# Altium footprint library ref-packages.PCBLIB: 1543 footprints (part 80 of 103)
Each footprint in its own frame and in the unit in brackets; x right, y up, seen from the top. Pads: shape width x height; smd on the part's side, far side on the other; paste and mask are expansions set on the pad; w line width, h text height; cw(c..) or ccw(c..) is an arc to the next point about the centre after c.
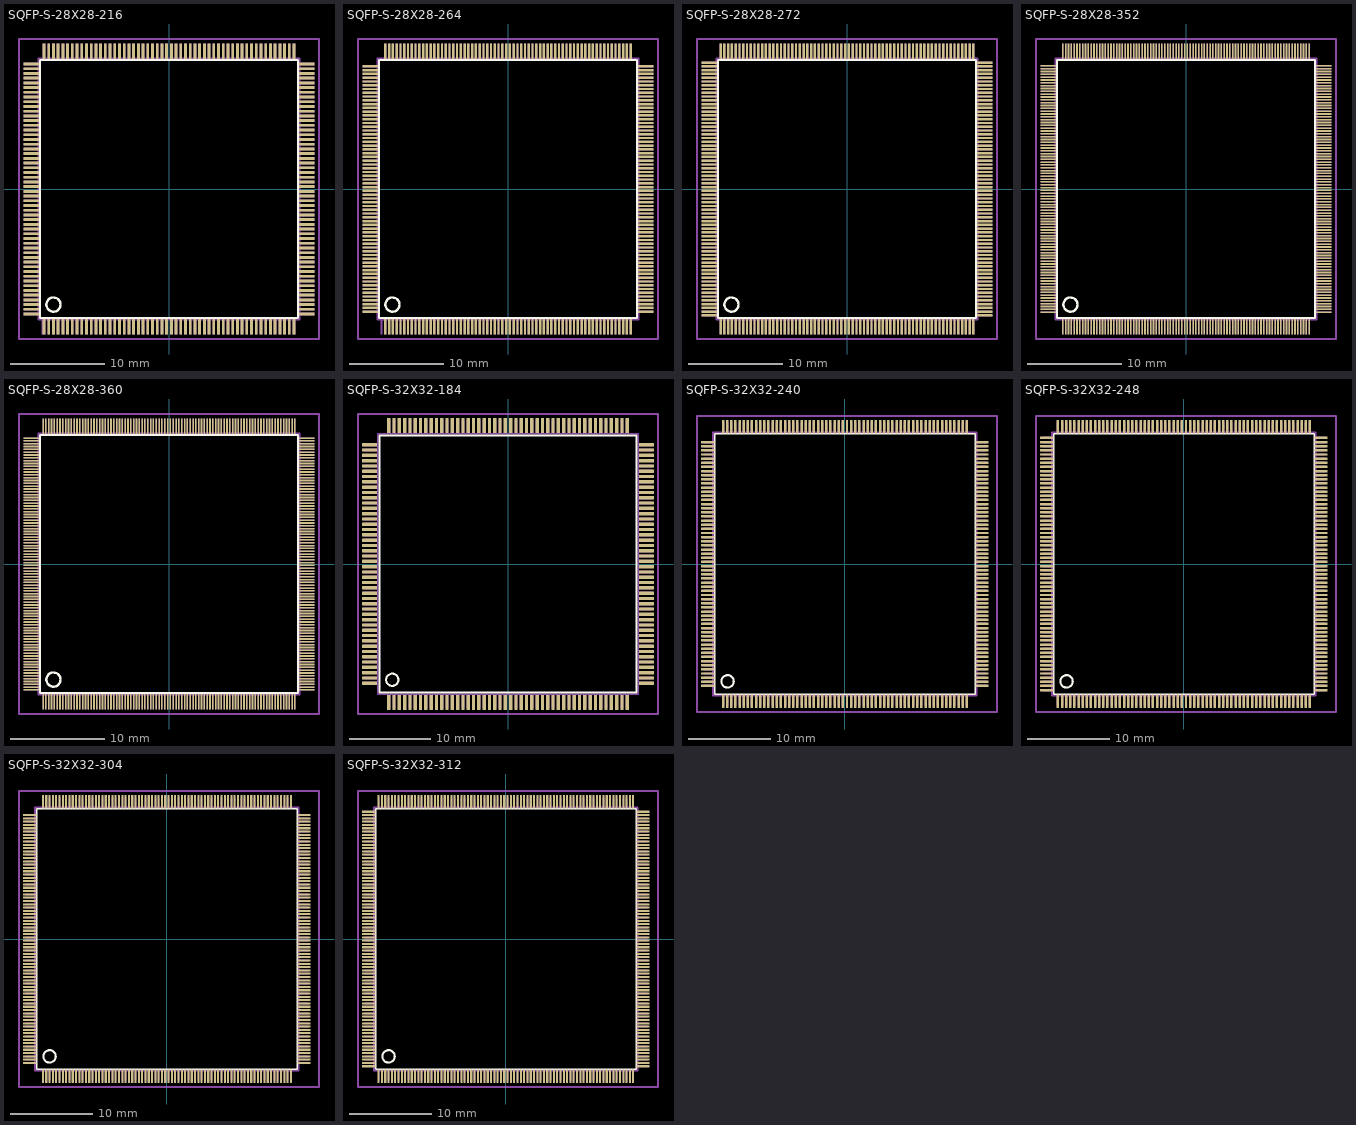
[diagram p79: the footprints below, top view; thin cyan lines are the x and y axes]

## SQFP-S-28X28-216 [mil]
pads (216):
  rect 11.81x62.99 smd: 1(-521.65,-574.8) 2(-501.97,-574.8) 3(-482.28,-574.8) 4(-462.6,-574.8) 5(-442.91,-574.8) 6(-423.23,-574.8) 7(-403.54,-574.8) 8(-383.86,-574.8) 9(-364.17,-574.8) 10(-344.49,-574.8) 11(-324.8,-574.8) 12(-305.12,-574.8) 13(-285.43,-574.8) 14(-265.75,-574.8) 15(-246.06,-574.8) 16(-226.38,-574.8) 17(-206.69,-574.8) 18(-187.01,-574.8) 19(-167.32,-574.8) 20(-147.64,-574.8) 21(-127.95,-574.8) 22(-108.27,-574.8) 23(-88.58,-574.8) 24(-68.9,-574.8) 25(-49.21,-574.8) 26(-29.53,-574.8) 27(-9.84,-574.8) 28(9.84,-574.8) 29(29.53,-574.8) 30(49.21,-574.8) 31(68.9,-574.8) 32(88.58,-574.8) 33(108.27,-574.8) 34(127.95,-574.8) 35(147.64,-574.8) 36(167.32,-574.8) 37(187.01,-574.8) 38(206.69,-574.8) 39(226.38,-574.8) 40(246.06,-574.8) 41(265.75,-574.8) 42(285.43,-574.8) 43(305.12,-574.8) 44(324.8,-574.8) 45(344.49,-574.8) 46(364.17,-574.8) 47(383.86,-574.8) 48(403.54,-574.8) 49(423.23,-574.8) 50(442.91,-574.8) 51(462.6,-574.8) 52(482.28,-574.8) 53(501.97,-574.8) 54(521.65,-574.8) 109(521.65,574.8) 110(501.97,574.8) 111(482.28,574.8) 112(462.6,574.8) 113(442.91,574.8) 114(423.23,574.8) 115(403.54,574.8) 116(383.86,574.8) 117(364.17,574.8) 118(344.49,574.8) 119(324.8,574.8) 120(305.12,574.8) 121(285.43,574.8) 122(265.75,574.8) 123(246.06,574.8) 124(226.38,574.8) 125(206.69,574.8) 126(187.01,574.8) 127(167.32,574.8) 128(147.64,574.8) 129(127.95,574.8) 130(108.27,574.8) 131(88.58,574.8) 132(68.9,574.8) 133(49.21,574.8) 134(29.53,574.8) 135(9.84,574.8) 136(-9.84,574.8) 137(-29.53,574.8) 138(-49.21,574.8) 139(-68.9,574.8) 140(-88.58,574.8) 141(-108.27,574.8) 142(-127.95,574.8) 143(-147.64,574.8) 144(-167.32,574.8) 145(-187.01,574.8) 146(-206.69,574.8) 147(-226.38,574.8) 148(-246.06,574.8) 149(-265.75,574.8) 150(-285.43,574.8) 151(-305.12,574.8) 152(-324.8,574.8) 153(-344.49,574.8) 154(-364.17,574.8) 155(-383.86,574.8) 156(-403.54,574.8) 157(-423.23,574.8) 158(-442.91,574.8) 159(-462.6,574.8) 160(-482.28,574.8) 161(-501.97,574.8) 162(-521.65,574.8)
  rect 62.99x11.81 smd: 55(574.8,-521.65) 56(574.8,-501.97) 57(574.8,-482.28) 58(574.8,-462.6) 59(574.8,-442.91) 60(574.8,-423.23) 61(574.8,-403.54) 62(574.8,-383.86) 63(574.8,-364.17) 64(574.8,-344.49) 65(574.8,-324.8) 66(574.8,-305.12) 67(574.8,-285.43) 68(574.8,-265.75) 69(574.8,-246.06) 70(574.8,-226.38) 71(574.8,-206.69) 72(574.8,-187.01) 73(574.8,-167.32) 74(574.8,-147.64) 75(574.8,-127.95) 76(574.8,-108.27) 77(574.8,-88.58) 78(574.8,-68.9) 79(574.8,-49.21) 80(574.8,-29.53) 81(574.8,-9.84) 82(574.8,9.84) 83(574.8,29.53) 84(574.8,49.21) 85(574.8,68.9) 86(574.8,88.58) 87(574.8,108.27) 88(574.8,127.95) 89(574.8,147.64) 90(574.8,167.32) 91(574.8,187.01) 92(574.8,206.69) 93(574.8,226.38) 94(574.8,246.06) 95(574.8,265.75) 96(574.8,285.43) 97(574.8,305.12) 98(574.8,324.8) 99(574.8,344.49) 100(574.8,364.17) 101(574.8,383.86) 102(574.8,403.54) 103(574.8,423.23) 104(574.8,442.91) 105(574.8,462.6) 106(574.8,482.28) 107(574.8,501.97) 108(574.8,521.65) 163(-574.8,521.65) 164(-574.8,501.97) 165(-574.8,482.28) 166(-574.8,462.6) 167(-574.8,442.91) 168(-574.8,423.23) 169(-574.8,403.54) 170(-574.8,383.86) 171(-574.8,364.17) 172(-574.8,344.49) 173(-574.8,324.8) 174(-574.8,305.12) 175(-574.8,285.43) 176(-574.8,265.75) 177(-574.8,246.06) 178(-574.8,226.38) 179(-574.8,206.69) 180(-574.8,187.01) 181(-574.8,167.32) 182(-574.8,147.64) 183(-574.8,127.95) 184(-574.8,108.27) 185(-574.8,88.58) 186(-574.8,68.9) 187(-574.8,49.21) 188(-574.8,29.53) 189(-574.8,9.84) 190(-574.8,-9.84) 191(-574.8,-29.53) 192(-574.8,-49.21) 193(-574.8,-68.9) 194(-574.8,-88.58) 195(-574.8,-108.27) 196(-574.8,-127.95) 197(-574.8,-147.64) 198(-574.8,-167.32) 199(-574.8,-187.01) 200(-574.8,-206.69) 201(-574.8,-226.38) 202(-574.8,-246.06) 203(-574.8,-265.75) 204(-574.8,-285.43) 205(-574.8,-305.12) 206(-574.8,-324.8) 207(-574.8,-344.49) 208(-574.8,-364.17) 209(-574.8,-383.86) 210(-574.8,-403.54) 211(-574.8,-423.23) 212(-574.8,-442.91) 213(-574.8,-462.6) 214(-574.8,-482.28) 215(-574.8,-501.97) 216(-574.8,-521.65)
Top Overlay:
  circle w10: c-482.28,-482.28 r29.52
  lines w8: -538.19,-537.8 537.8,-537.8 537.8,537.8 -538.19,537.8 -538.19,-537.8
Mechanical 16:
  drawing of 221 lines, arcs and shapes, not listed
Mechanical 27:
  lines w7.87: -625.98,-625.98 -625.98,625.98 625.98,625.98 625.98,-625.98 -625.98,-625.98

## SQFP-S-28X28-264 [mm]
pads (264):
  rect 0.25x1.6 smd: 1(-13,-14.6) 2(-12.6,-14.6) 3(-12.2,-14.6) 4(-11.8,-14.6) 5(-11.4,-14.6) 6(-11,-14.6) 7(-10.6,-14.6) 8(-10.2,-14.6) 9(-9.8,-14.6) 10(-9.4,-14.6) 11(-9,-14.6) 12(-8.6,-14.6) 13(-8.2,-14.6) 14(-7.8,-14.6) 15(-7.4,-14.6) 16(-7,-14.6) 17(-6.6,-14.6) 18(-6.2,-14.6) 19(-5.8,-14.6) 20(-5.4,-14.6) 21(-5,-14.6) 22(-4.6,-14.6) 23(-4.2,-14.6) 24(-3.8,-14.6) 25(-3.4,-14.6) 26(-3,-14.6) 27(-2.6,-14.6) 28(-2.2,-14.6) 29(-1.8,-14.6) 30(-1.4,-14.6) 31(-1,-14.6) 32(-0.6,-14.6) 33(-0.2,-14.6) 34(0.2,-14.6) 35(0.6,-14.6) 36(1,-14.6) 37(1.4,-14.6) 38(1.8,-14.6) 39(2.2,-14.6) 40(2.6,-14.6) 41(3,-14.6) 42(3.4,-14.6) 43(3.8,-14.6) 44(4.2,-14.6) 45(4.6,-14.6) 46(5,-14.6) 47(5.4,-14.6) 48(5.8,-14.6) 49(6.2,-14.6) 50(6.6,-14.6) 51(7,-14.6) 52(7.4,-14.6) 53(7.8,-14.6) 54(8.2,-14.6) 55(8.6,-14.6) 56(9,-14.6) 57(9.4,-14.6) 58(9.8,-14.6) 59(10.2,-14.6) 60(10.6,-14.6) 61(11,-14.6) 62(11.4,-14.6) 63(11.8,-14.6) 64(12.2,-14.6) 65(12.6,-14.6) 66(13,-14.6) 133(13,14.6) 134(12.6,14.6) 135(12.2,14.6) 136(11.8,14.6) 137(11.4,14.6) 138(11,14.6) 139(10.6,14.6) 140(10.2,14.6) 141(9.8,14.6) 142(9.4,14.6) 143(9,14.6) 144(8.6,14.6) 145(8.2,14.6) 146(7.8,14.6) 147(7.4,14.6) 148(7,14.6) 149(6.6,14.6) 150(6.2,14.6) 151(5.8,14.6) 152(5.4,14.6) 153(5,14.6) 154(4.6,14.6) 155(4.2,14.6) 156(3.8,14.6) 157(3.4,14.6) 158(3,14.6) 159(2.6,14.6) 160(2.2,14.6) 161(1.8,14.6) 162(1.4,14.6) 163(1,14.6) 164(0.6,14.6) 165(0.2,14.6) 166(-0.2,14.6) 167(-0.6,14.6) 168(-1,14.6) 169(-1.4,14.6) 170(-1.8,14.6) 171(-2.2,14.6) 172(-2.6,14.6) 173(-3,14.6) 174(-3.4,14.6) 175(-3.8,14.6) 176(-4.2,14.6) 177(-4.6,14.6) 178(-5,14.6) 179(-5.4,14.6) 180(-5.8,14.6) 181(-6.2,14.6) 182(-6.6,14.6) 183(-7,14.6) 184(-7.4,14.6) 185(-7.8,14.6) 186(-8.2,14.6) 187(-8.6,14.6) 188(-9,14.6) 189(-9.4,14.6) 190(-9.8,14.6) 191(-10.2,14.6) 192(-10.6,14.6) 193(-11,14.6) 194(-11.4,14.6) 195(-11.8,14.6) 196(-12.2,14.6) 197(-12.6,14.6) 198(-13,14.6)
  rect 1.6x0.25 smd: 67(14.6,-13) 68(14.6,-12.6) 69(14.6,-12.2) 70(14.6,-11.8) 71(14.6,-11.4) 72(14.6,-11) 73(14.6,-10.6) 74(14.6,-10.2) 75(14.6,-9.8) 76(14.6,-9.4) 77(14.6,-9) 78(14.6,-8.6) 79(14.6,-8.2) 80(14.6,-7.8) 81(14.6,-7.4) 82(14.6,-7) 83(14.6,-6.6) 84(14.6,-6.2) 85(14.6,-5.8) 86(14.6,-5.4) 87(14.6,-5) 88(14.6,-4.6) 89(14.6,-4.2) 90(14.6,-3.8) 91(14.6,-3.4) 92(14.6,-3) 93(14.6,-2.6) 94(14.6,-2.2) 95(14.6,-1.8) 96(14.6,-1.4) 97(14.6,-1) 98(14.6,-0.6) 99(14.6,-0.2) 100(14.6,0.2) 101(14.6,0.6) 102(14.6,1) 103(14.6,1.4) 104(14.6,1.8) 105(14.6,2.2) 106(14.6,2.6) 107(14.6,3) 108(14.6,3.4) 109(14.6,3.8) 110(14.6,4.2) 111(14.6,4.6) 112(14.6,5) 113(14.6,5.4) 114(14.6,5.8) 115(14.6,6.2) 116(14.6,6.6) 117(14.6,7) 118(14.6,7.4) 119(14.6,7.8) 120(14.6,8.2) 121(14.6,8.6) 122(14.6,9) 123(14.6,9.4) 124(14.6,9.8) 125(14.6,10.2) 126(14.6,10.6) 127(14.6,11) 128(14.6,11.4) 129(14.6,11.8) 130(14.6,12.2) 131(14.6,12.6) 132(14.6,13) 199(-14.6,13) 200(-14.6,12.6) 201(-14.6,12.2) 202(-14.6,11.8) 203(-14.6,11.4) 204(-14.6,11) 205(-14.6,10.6) 206(-14.6,10.2) 207(-14.6,9.8) 208(-14.6,9.4) 209(-14.6,9) 210(-14.6,8.6) 211(-14.6,8.2) 212(-14.6,7.8) 213(-14.6,7.4) 214(-14.6,7) 215(-14.6,6.6) 216(-14.6,6.2) 217(-14.6,5.8) 218(-14.6,5.4) 219(-14.6,5) 220(-14.6,4.6) 221(-14.6,4.2) 222(-14.6,3.8) 223(-14.6,3.4) 224(-14.6,3) 225(-14.6,2.6) 226(-14.6,2.2) 227(-14.6,1.8) 228(-14.6,1.4) 229(-14.6,1) 230(-14.6,0.6) 231(-14.6,0.2) 232(-14.6,-0.2) 233(-14.6,-0.6) 234(-14.6,-1) 235(-14.6,-1.4) 236(-14.6,-1.8) 237(-14.6,-2.2) 238(-14.6,-2.6) 239(-14.6,-3) 240(-14.6,-3.4) 241(-14.6,-3.8) 242(-14.6,-4.2) 243(-14.6,-4.6) 244(-14.6,-5) 245(-14.6,-5.4) 246(-14.6,-5.8) 247(-14.6,-6.2) 248(-14.6,-6.6) 249(-14.6,-7) 250(-14.6,-7.4) 251(-14.6,-7.8) 252(-14.6,-8.2) 253(-14.6,-8.6) 254(-14.6,-9) 255(-14.6,-9.4) 256(-14.6,-9.8) 257(-14.6,-10.2) 258(-14.6,-10.6) 259(-14.6,-11) 260(-14.6,-11.4) 261(-14.6,-11.8) 262(-14.6,-12.2) 263(-14.6,-12.6) 264(-14.6,-13)
Top Overlay:
  circle w0.254: c-12.25,-12.25 r0.75
  lines w0.203: -13.67,-13.66 13.66,-13.66 13.66,13.66 -13.67,13.66 -13.67,-13.66
Mechanical 16:
  drawing of 269 lines, arcs and shapes, not listed
Mechanical 27:
  lines w0.2: -15.9,-15.9 -15.9,15.9 15.9,15.9 15.9,-15.9 -15.9,-15.9

## SQFP-S-28X28-272 [mm]
pads (272):
  rect 0.25x1.6 smd: 1(-13.4,-14.6) 2(-13,-14.6) 3(-12.6,-14.6) 4(-12.2,-14.6) 5(-11.8,-14.6) 6(-11.4,-14.6) 7(-11,-14.6) 8(-10.6,-14.6) 9(-10.2,-14.6) 10(-9.8,-14.6) 11(-9.4,-14.6) 12(-9,-14.6) 13(-8.6,-14.6) 14(-8.2,-14.6) 15(-7.8,-14.6) 16(-7.4,-14.6) 17(-7,-14.6) 18(-6.6,-14.6) 19(-6.2,-14.6) 20(-5.8,-14.6) 21(-5.4,-14.6) 22(-5,-14.6) 23(-4.6,-14.6) 24(-4.2,-14.6) 25(-3.8,-14.6) 26(-3.4,-14.6) 27(-3,-14.6) 28(-2.6,-14.6) 29(-2.2,-14.6) 30(-1.8,-14.6) 31(-1.4,-14.6) 32(-1,-14.6) 33(-0.6,-14.6) 34(-0.2,-14.6) 35(0.2,-14.6) 36(0.6,-14.6) 37(1,-14.6) 38(1.4,-14.6) 39(1.8,-14.6) 40(2.2,-14.6) 41(2.6,-14.6) 42(3,-14.6) 43(3.4,-14.6) 44(3.8,-14.6) 45(4.2,-14.6) 46(4.6,-14.6) 47(5,-14.6) 48(5.4,-14.6) 49(5.8,-14.6) 50(6.2,-14.6) 51(6.6,-14.6) 52(7,-14.6) 53(7.4,-14.6) 54(7.8,-14.6) 55(8.2,-14.6) 56(8.6,-14.6) 57(9,-14.6) 58(9.4,-14.6) 59(9.8,-14.6) 60(10.2,-14.6) 61(10.6,-14.6) 62(11,-14.6) 63(11.4,-14.6) 64(11.8,-14.6) 65(12.2,-14.6) 66(12.6,-14.6) 67(13,-14.6) 68(13.4,-14.6) 137(13.4,14.6) 138(13,14.6) 139(12.6,14.6) 140(12.2,14.6) 141(11.8,14.6) 142(11.4,14.6) 143(11,14.6) 144(10.6,14.6) 145(10.2,14.6) 146(9.8,14.6) 147(9.4,14.6) 148(9,14.6) 149(8.6,14.6) 150(8.2,14.6) 151(7.8,14.6) 152(7.4,14.6) 153(7,14.6) 154(6.6,14.6) 155(6.2,14.6) 156(5.8,14.6) 157(5.4,14.6) 158(5,14.6) 159(4.6,14.6) 160(4.2,14.6) 161(3.8,14.6) 162(3.4,14.6) 163(3,14.6) 164(2.6,14.6) 165(2.2,14.6) 166(1.8,14.6) 167(1.4,14.6) 168(1,14.6) 169(0.6,14.6) 170(0.2,14.6) 171(-0.2,14.6) 172(-0.6,14.6) 173(-1,14.6) 174(-1.4,14.6) 175(-1.8,14.6) 176(-2.2,14.6) 177(-2.6,14.6) 178(-3,14.6) 179(-3.4,14.6) 180(-3.8,14.6) 181(-4.2,14.6) 182(-4.6,14.6) 183(-5,14.6) 184(-5.4,14.6) 185(-5.8,14.6) 186(-6.2,14.6) 187(-6.6,14.6) 188(-7,14.6) 189(-7.4,14.6) 190(-7.8,14.6) 191(-8.2,14.6) 192(-8.6,14.6) 193(-9,14.6) 194(-9.4,14.6) 195(-9.8,14.6) 196(-10.2,14.6) 197(-10.6,14.6) 198(-11,14.6) 199(-11.4,14.6) 200(-11.8,14.6) 201(-12.2,14.6) 202(-12.6,14.6) 203(-13,14.6) 204(-13.4,14.6)
  rect 1.6x0.25 smd: 69(14.6,-13.4) 70(14.6,-13) 71(14.6,-12.6) 72(14.6,-12.2) 73(14.6,-11.8) 74(14.6,-11.4) 75(14.6,-11) 76(14.6,-10.6) 77(14.6,-10.2) 78(14.6,-9.8) 79(14.6,-9.4) 80(14.6,-9) 81(14.6,-8.6) 82(14.6,-8.2) 83(14.6,-7.8) 84(14.6,-7.4) 85(14.6,-7) 86(14.6,-6.6) 87(14.6,-6.2) 88(14.6,-5.8) 89(14.6,-5.4) 90(14.6,-5) 91(14.6,-4.6) 92(14.6,-4.2) 93(14.6,-3.8) 94(14.6,-3.4) 95(14.6,-3) 96(14.6,-2.6) 97(14.6,-2.2) 98(14.6,-1.8) 99(14.6,-1.4) 100(14.6,-1) 101(14.6,-0.6) 102(14.6,-0.2) 103(14.6,0.2) 104(14.6,0.6) 105(14.6,1) 106(14.6,1.4) 107(14.6,1.8) 108(14.6,2.2) 109(14.6,2.6) 110(14.6,3) 111(14.6,3.4) 112(14.6,3.8) 113(14.6,4.2) 114(14.6,4.6) 115(14.6,5) 116(14.6,5.4) 117(14.6,5.8) 118(14.6,6.2) 119(14.6,6.6) 120(14.6,7) 121(14.6,7.4) 122(14.6,7.8) 123(14.6,8.2) 124(14.6,8.6) 125(14.6,9) 126(14.6,9.4) 127(14.6,9.8) 128(14.6,10.2) 129(14.6,10.6) 130(14.6,11) 131(14.6,11.4) 132(14.6,11.8) 133(14.6,12.2) 134(14.6,12.6) 135(14.6,13) 136(14.6,13.4) 205(-14.6,13.4) 206(-14.6,13) 207(-14.6,12.6) 208(-14.6,12.2) 209(-14.6,11.8) 210(-14.6,11.4) 211(-14.6,11) 212(-14.6,10.6) 213(-14.6,10.2) 214(-14.6,9.8) 215(-14.6,9.4) 216(-14.6,9) 217(-14.6,8.6) 218(-14.6,8.2) 219(-14.6,7.8) 220(-14.6,7.4) 221(-14.6,7) 222(-14.6,6.6) 223(-14.6,6.2) 224(-14.6,5.8) 225(-14.6,5.4) 226(-14.6,5) 227(-14.6,4.6) 228(-14.6,4.2) 229(-14.6,3.8) 230(-14.6,3.4) 231(-14.6,3) 232(-14.6,2.6) 233(-14.6,2.2) 234(-14.6,1.8) 235(-14.6,1.4) 236(-14.6,1) 237(-14.6,0.6) 238(-14.6,0.2) 239(-14.6,-0.2) 240(-14.6,-0.6) 241(-14.6,-1) 242(-14.6,-1.4) 243(-14.6,-1.8) 244(-14.6,-2.2) 245(-14.6,-2.6) 246(-14.6,-3) 247(-14.6,-3.4) 248(-14.6,-3.8) 249(-14.6,-4.2) 250(-14.6,-4.6) 251(-14.6,-5) 252(-14.6,-5.4) 253(-14.6,-5.8) 254(-14.6,-6.2) 255(-14.6,-6.6) 256(-14.6,-7) 257(-14.6,-7.4) 258(-14.6,-7.8) 259(-14.6,-8.2) 260(-14.6,-8.6) 261(-14.6,-9) 262(-14.6,-9.4) 263(-14.6,-9.8) 264(-14.6,-10.2) 265(-14.6,-10.6) 266(-14.6,-11) 267(-14.6,-11.4) 268(-14.6,-11.8) 269(-14.6,-12.2) 270(-14.6,-12.6) 271(-14.6,-13) 272(-14.6,-13.4)
Top Overlay:
  circle w0.254: c-12.25,-12.25 r0.75
  lines w0.203: -13.67,-13.66 13.66,-13.66 13.66,13.66 -13.67,13.66 -13.67,-13.66
Mechanical 16:
  drawing of 276 lines, arcs and shapes, not listed
Mechanical 27:
  lines w0.2: -15.9,-15.9 -15.9,15.9 15.9,15.9 15.9,-15.9 -15.9,-15.9

## SQFP-S-28X28-352 [mm]
pads (352):
  rect 0.17x1.6 smd: 1(-13.05,-14.6) 2(-12.75,-14.6) 3(-12.45,-14.6) 4(-12.15,-14.6) 5(-11.85,-14.6) 6(-11.55,-14.6) 7(-11.25,-14.6) 8(-10.95,-14.6) 9(-10.65,-14.6) 10(-10.35,-14.6) 11(-10.05,-14.6) 12(-9.75,-14.6) 13(-9.45,-14.6) 14(-9.15,-14.6) 15(-8.85,-14.6) 16(-8.55,-14.6) 17(-8.25,-14.6) 18(-7.95,-14.6) 19(-7.65,-14.6) 20(-7.35,-14.6) 21(-7.05,-14.6) 22(-6.75,-14.6) 23(-6.45,-14.6) 24(-6.15,-14.6) 25(-5.85,-14.6) 26(-5.55,-14.6) 27(-5.25,-14.6) 28(-4.95,-14.6) 29(-4.65,-14.6) 30(-4.35,-14.6) 31(-4.05,-14.6) 32(-3.75,-14.6) 33(-3.45,-14.6) 34(-3.15,-14.6) 35(-2.85,-14.6) 36(-2.55,-14.6) 37(-2.25,-14.6) 38(-1.95,-14.6) 39(-1.65,-14.6) 40(-1.35,-14.6) 41(-1.05,-14.6) 42(-0.75,-14.6) 43(-0.45,-14.6) 44(-0.15,-14.6) 45(0.15,-14.6) 46(0.45,-14.6) 47(0.75,-14.6) 48(1.05,-14.6) 49(1.35,-14.6) 50(1.65,-14.6) 51(1.95,-14.6) 52(2.25,-14.6) 53(2.55,-14.6) 54(2.85,-14.6) 55(3.15,-14.6) 56(3.45,-14.6) 57(3.75,-14.6) 58(4.05,-14.6) 59(4.35,-14.6) 60(4.65,-14.6) 61(4.95,-14.6) 62(5.25,-14.6) 63(5.55,-14.6) 64(5.85,-14.6) 65(6.15,-14.6) 66(6.45,-14.6) 67(6.75,-14.6) 68(7.05,-14.6) 69(7.35,-14.6) 70(7.65,-14.6) 71(7.95,-14.6) 72(8.25,-14.6) 73(8.55,-14.6) 74(8.85,-14.6) 75(9.15,-14.6) 76(9.45,-14.6) 77(9.75,-14.6) 78(10.05,-14.6) 79(10.35,-14.6) 80(10.65,-14.6) 81(10.95,-14.6) 82(11.25,-14.6) 83(11.55,-14.6) 84(11.85,-14.6) 85(12.15,-14.6) 86(12.45,-14.6) 87(12.75,-14.6) 88(13.05,-14.6) 177(13.05,14.6) 178(12.75,14.6) 179(12.45,14.6) 180(12.15,14.6) 181(11.85,14.6) 182(11.55,14.6) 183(11.25,14.6) 184(10.95,14.6) 185(10.65,14.6) 186(10.35,14.6) 187(10.05,14.6) 188(9.75,14.6) 189(9.45,14.6) 190(9.15,14.6) 191(8.85,14.6) 192(8.55,14.6) 193(8.25,14.6) 194(7.95,14.6) 195(7.65,14.6) 196(7.35,14.6) 197(7.05,14.6) 198(6.75,14.6) 199(6.45,14.6) 200(6.15,14.6) 201(5.85,14.6) 202(5.55,14.6) 203(5.25,14.6) 204(4.95,14.6) 205(4.65,14.6) 206(4.35,14.6) 207(4.05,14.6) 208(3.75,14.6) 209(3.45,14.6) 210(3.15,14.6) 211(2.85,14.6) 212(2.55,14.6) 213(2.25,14.6) 214(1.95,14.6) 215(1.65,14.6) 216(1.35,14.6) 217(1.05,14.6) 218(0.75,14.6) 219(0.45,14.6) 220(0.15,14.6) 221(-0.15,14.6) 222(-0.45,14.6) 223(-0.75,14.6) 224(-1.05,14.6) 225(-1.35,14.6) 226(-1.65,14.6) 227(-1.95,14.6) 228(-2.25,14.6) 229(-2.55,14.6) 230(-2.85,14.6) 231(-3.15,14.6) 232(-3.45,14.6) 233(-3.75,14.6) 234(-4.05,14.6) 235(-4.35,14.6) 236(-4.65,14.6) 237(-4.95,14.6) 238(-5.25,14.6) 239(-5.55,14.6) 240(-5.85,14.6) 241(-6.15,14.6) 242(-6.45,14.6) 243(-6.75,14.6) 244(-7.05,14.6) 245(-7.35,14.6) 246(-7.65,14.6) 247(-7.95,14.6) 248(-8.25,14.6) 249(-8.55,14.6) 250(-8.85,14.6) 251(-9.15,14.6) 252(-9.45,14.6) 253(-9.75,14.6) 254(-10.05,14.6) 255(-10.35,14.6) 256(-10.65,14.6) 257(-10.95,14.6) 258(-11.25,14.6) 259(-11.55,14.6) 260(-11.85,14.6) 261(-12.15,14.6) 262(-12.45,14.6) 263(-12.75,14.6) 264(-13.05,14.6)
  rect 1.6x0.17 smd: 89(14.6,-13.05) 90(14.6,-12.75) 91(14.6,-12.45) 92(14.6,-12.15) 93(14.6,-11.85) 94(14.6,-11.55) 95(14.6,-11.25) 96(14.6,-10.95) 97(14.6,-10.65) 98(14.6,-10.35) 99(14.6,-10.05) 100(14.6,-9.75) 101(14.6,-9.45) 102(14.6,-9.15) 103(14.6,-8.85) 104(14.6,-8.55) 105(14.6,-8.25) 106(14.6,-7.95) 107(14.6,-7.65) 108(14.6,-7.35) 109(14.6,-7.05) 110(14.6,-6.75) 111(14.6,-6.45) 112(14.6,-6.15) 113(14.6,-5.85) 114(14.6,-5.55) 115(14.6,-5.25) 116(14.6,-4.95) 117(14.6,-4.65) 118(14.6,-4.35) 119(14.6,-4.05) 120(14.6,-3.75) 121(14.6,-3.45) 122(14.6,-3.15) 123(14.6,-2.85) 124(14.6,-2.55) 125(14.6,-2.25) 126(14.6,-1.95) 127(14.6,-1.65) 128(14.6,-1.35) 129(14.6,-1.05) 130(14.6,-0.75) 131(14.6,-0.45) 132(14.6,-0.15) 133(14.6,0.15) 134(14.6,0.45) 135(14.6,0.75) 136(14.6,1.05) 137(14.6,1.35) 138(14.6,1.65) 139(14.6,1.95) 140(14.6,2.25) 141(14.6,2.55) 142(14.6,2.85) 143(14.6,3.15) 144(14.6,3.45) 145(14.6,3.75) 146(14.6,4.05) 147(14.6,4.35) 148(14.6,4.65) 149(14.6,4.95) 150(14.6,5.25) 151(14.6,5.55) 152(14.6,5.85) 153(14.6,6.15) 154(14.6,6.45) 155(14.6,6.75) 156(14.6,7.05) 157(14.6,7.35) 158(14.6,7.65) 159(14.6,7.95) 160(14.6,8.25) 161(14.6,8.55) 162(14.6,8.85) 163(14.6,9.15) 164(14.6,9.45) 165(14.6,9.75) 166(14.6,10.05) 167(14.6,10.35) 168(14.6,10.65) 169(14.6,10.95) 170(14.6,11.25) 171(14.6,11.55) 172(14.6,11.85) 173(14.6,12.15) 174(14.6,12.45) 175(14.6,12.75) 176(14.6,13.05) 265(-14.6,13.05) 266(-14.6,12.75) 267(-14.6,12.45) 268(-14.6,12.15) 269(-14.6,11.85) 270(-14.6,11.55) 271(-14.6,11.25) 272(-14.6,10.95) 273(-14.6,10.65) 274(-14.6,10.35) 275(-14.6,10.05) 276(-14.6,9.75) 277(-14.6,9.45) 278(-14.6,9.15) 279(-14.6,8.85) 280(-14.6,8.55) 281(-14.6,8.25) 282(-14.6,7.95) 283(-14.6,7.65) 284(-14.6,7.35) 285(-14.6,7.05) 286(-14.6,6.75) 287(-14.6,6.45) 288(-14.6,6.15) 289(-14.6,5.85) 290(-14.6,5.55) 291(-14.6,5.25) 292(-14.6,4.95) 293(-14.6,4.65) 294(-14.6,4.35) 295(-14.6,4.05) 296(-14.6,3.75) 297(-14.6,3.45) 298(-14.6,3.15) 299(-14.6,2.85) 300(-14.6,2.55) 301(-14.6,2.25) 302(-14.6,1.95) 303(-14.6,1.65) 304(-14.6,1.35) 305(-14.6,1.05) 306(-14.6,0.75) 307(-14.6,0.45) 308(-14.6,0.15) 309(-14.6,-0.15) 310(-14.6,-0.45) 311(-14.6,-0.75) 312(-14.6,-1.05) 313(-14.6,-1.35) 314(-14.6,-1.65) 315(-14.6,-1.95) 316(-14.6,-2.25) 317(-14.6,-2.55) 318(-14.6,-2.85) 319(-14.6,-3.15) 320(-14.6,-3.45) 321(-14.6,-3.75) 322(-14.6,-4.05) 323(-14.6,-4.35) 324(-14.6,-4.65) 325(-14.6,-4.95) 326(-14.6,-5.25) 327(-14.6,-5.55) 328(-14.6,-5.85) 329(-14.6,-6.15) 330(-14.6,-6.45) 331(-14.6,-6.75) 332(-14.6,-7.05) 333(-14.6,-7.35) 334(-14.6,-7.65) 335(-14.6,-7.95) 336(-14.6,-8.25) 337(-14.6,-8.55) 338(-14.6,-8.85) 339(-14.6,-9.15) 340(-14.6,-9.45) 341(-14.6,-9.75) 342(-14.6,-10.05) 343(-14.6,-10.35) 344(-14.6,-10.65) 345(-14.6,-10.95) 346(-14.6,-11.25) 347(-14.6,-11.55) 348(-14.6,-11.85) 349(-14.6,-12.15) 350(-14.6,-12.45) 351(-14.6,-12.75) 352(-14.6,-13.05)
Top Overlay:
  circle w0.254: c-12.25,-12.25 r0.75
  lines w0.203: -13.67,-13.66 13.66,-13.66 13.66,13.66 -13.67,13.66 -13.67,-13.66
Mechanical 16:
  drawing of 356 lines, arcs and shapes, not listed
Mechanical 27:
  lines w0.2: -15.9,-15.9 -15.9,15.9 15.9,15.9 15.9,-15.9 -15.9,-15.9

## SQFP-S-28X28-360 [mm]
pads (360):
  rect 0.17x1.6 smd: 1(-13.35,-14.6) 2(-13.05,-14.6) 3(-12.75,-14.6) 4(-12.45,-14.6) 5(-12.15,-14.6) 6(-11.85,-14.6) 7(-11.55,-14.6) 8(-11.25,-14.6) 9(-10.95,-14.6) 10(-10.65,-14.6) 11(-10.35,-14.6) 12(-10.05,-14.6) 13(-9.75,-14.6) 14(-9.45,-14.6) 15(-9.15,-14.6) 16(-8.85,-14.6) 17(-8.55,-14.6) 18(-8.25,-14.6) 19(-7.95,-14.6) 20(-7.65,-14.6) 21(-7.35,-14.6) 22(-7.05,-14.6) 23(-6.75,-14.6) 24(-6.45,-14.6) 25(-6.15,-14.6) 26(-5.85,-14.6) 27(-5.55,-14.6) 28(-5.25,-14.6) 29(-4.95,-14.6) 30(-4.65,-14.6) 31(-4.35,-14.6) 32(-4.05,-14.6) 33(-3.75,-14.6) 34(-3.45,-14.6) 35(-3.15,-14.6) 36(-2.85,-14.6) 37(-2.55,-14.6) 38(-2.25,-14.6) 39(-1.95,-14.6) 40(-1.65,-14.6) 41(-1.35,-14.6) 42(-1.05,-14.6) 43(-0.75,-14.6) 44(-0.45,-14.6) 45(-0.15,-14.6) 46(0.15,-14.6) 47(0.45,-14.6) 48(0.75,-14.6) 49(1.05,-14.6) 50(1.35,-14.6) 51(1.65,-14.6) 52(1.95,-14.6) 53(2.25,-14.6) 54(2.55,-14.6) 55(2.85,-14.6) 56(3.15,-14.6) 57(3.45,-14.6) 58(3.75,-14.6) 59(4.05,-14.6) 60(4.35,-14.6) 61(4.65,-14.6) 62(4.95,-14.6) 63(5.25,-14.6) 64(5.55,-14.6) 65(5.85,-14.6) 66(6.15,-14.6) 67(6.45,-14.6) 68(6.75,-14.6) 69(7.05,-14.6) 70(7.35,-14.6) 71(7.65,-14.6) 72(7.95,-14.6) 73(8.25,-14.6) 74(8.55,-14.6) 75(8.85,-14.6) 76(9.15,-14.6) 77(9.45,-14.6) 78(9.75,-14.6) 79(10.05,-14.6) 80(10.35,-14.6) 81(10.65,-14.6) 82(10.95,-14.6) 83(11.25,-14.6) 84(11.55,-14.6) 85(11.85,-14.6) 86(12.15,-14.6) 87(12.45,-14.6) 88(12.75,-14.6) 89(13.05,-14.6) 90(13.35,-14.6) 181(13.35,14.6) 182(13.05,14.6) 183(12.75,14.6) 184(12.45,14.6) 185(12.15,14.6) 186(11.85,14.6) 187(11.55,14.6) 188(11.25,14.6) 189(10.95,14.6) 190(10.65,14.6) 191(10.35,14.6) 192(10.05,14.6) 193(9.75,14.6) 194(9.45,14.6) 195(9.15,14.6) 196(8.85,14.6) 197(8.55,14.6) 198(8.25,14.6) 199(7.95,14.6) 200(7.65,14.6) 201(7.35,14.6) 202(7.05,14.6) 203(6.75,14.6) 204(6.45,14.6) 205(6.15,14.6) 206(5.85,14.6) 207(5.55,14.6) 208(5.25,14.6) 209(4.95,14.6) 210(4.65,14.6) 211(4.35,14.6) 212(4.05,14.6) 213(3.75,14.6) 214(3.45,14.6) 215(3.15,14.6) 216(2.85,14.6) 217(2.55,14.6) 218(2.25,14.6) 219(1.95,14.6) 220(1.65,14.6) 221(1.35,14.6) 222(1.05,14.6) 223(0.75,14.6) 224(0.45,14.6) 225(0.15,14.6) 226(-0.15,14.6) 227(-0.45,14.6) 228(-0.75,14.6) 229(-1.05,14.6) 230(-1.35,14.6) 231(-1.65,14.6) 232(-1.95,14.6) 233(-2.25,14.6) 234(-2.55,14.6) 235(-2.85,14.6) 236(-3.15,14.6) 237(-3.45,14.6) 238(-3.75,14.6) 239(-4.05,14.6) 240(-4.35,14.6) 241(-4.65,14.6) 242(-4.95,14.6) 243(-5.25,14.6) 244(-5.55,14.6) 245(-5.85,14.6) 246(-6.15,14.6) 247(-6.45,14.6) 248(-6.75,14.6) 249(-7.05,14.6) 250(-7.35,14.6) 251(-7.65,14.6) 252(-7.95,14.6) 253(-8.25,14.6) 254(-8.55,14.6) 255(-8.85,14.6) 256(-9.15,14.6) 257(-9.45,14.6) 258(-9.75,14.6) 259(-10.05,14.6) 260(-10.35,14.6) 261(-10.65,14.6) 262(-10.95,14.6) 263(-11.25,14.6) 264(-11.55,14.6) 265(-11.85,14.6) 266(-12.15,14.6) 267(-12.45,14.6) 268(-12.75,14.6) 269(-13.05,14.6) 270(-13.35,14.6)
  rect 1.6x0.17 smd: 91(14.6,-13.35) 92(14.6,-13.05) 93(14.6,-12.75) 94(14.6,-12.45) 95(14.6,-12.15) 96(14.6,-11.85) 97(14.6,-11.55) 98(14.6,-11.25) 99(14.6,-10.95) 100(14.6,-10.65) 101(14.6,-10.35) 102(14.6,-10.05) 103(14.6,-9.75) 104(14.6,-9.45) 105(14.6,-9.15) 106(14.6,-8.85) 107(14.6,-8.55) 108(14.6,-8.25) 109(14.6,-7.95) 110(14.6,-7.65) 111(14.6,-7.35) 112(14.6,-7.05) 113(14.6,-6.75) 114(14.6,-6.45) 115(14.6,-6.15) 116(14.6,-5.85) 117(14.6,-5.55) 118(14.6,-5.25) 119(14.6,-4.95) 120(14.6,-4.65) 121(14.6,-4.35) 122(14.6,-4.05) 123(14.6,-3.75) 124(14.6,-3.45) 125(14.6,-3.15) 126(14.6,-2.85) 127(14.6,-2.55) 128(14.6,-2.25) 129(14.6,-1.95) 130(14.6,-1.65) 131(14.6,-1.35) 132(14.6,-1.05) 133(14.6,-0.75) 134(14.6,-0.45) 135(14.6,-0.15) 136(14.6,0.15) 137(14.6,0.45) 138(14.6,0.75) 139(14.6,1.05) 140(14.6,1.35) 141(14.6,1.65) 142(14.6,1.95) 143(14.6,2.25) 144(14.6,2.55) 145(14.6,2.85) 146(14.6,3.15) 147(14.6,3.45) 148(14.6,3.75) 149(14.6,4.05) 150(14.6,4.35) 151(14.6,4.65) 152(14.6,4.95) 153(14.6,5.25) 154(14.6,5.55) 155(14.6,5.85) 156(14.6,6.15) 157(14.6,6.45) 158(14.6,6.75) 159(14.6,7.05) 160(14.6,7.35) 161(14.6,7.65) 162(14.6,7.95) 163(14.6,8.25) 164(14.6,8.55) 165(14.6,8.85) 166(14.6,9.15) 167(14.6,9.45) 168(14.6,9.75) 169(14.6,10.05) 170(14.6,10.35) 171(14.6,10.65) 172(14.6,10.95) 173(14.6,11.25) 174(14.6,11.55) 175(14.6,11.85) 176(14.6,12.15) 177(14.6,12.45) 178(14.6,12.75) 179(14.6,13.05) 180(14.6,13.35) 271(-14.6,13.35) 272(-14.6,13.05) 273(-14.6,12.75) 274(-14.6,12.45) 275(-14.6,12.15) 276(-14.6,11.85) 277(-14.6,11.55) 278(-14.6,11.25) 279(-14.6,10.95) 280(-14.6,10.65) 281(-14.6,10.35) 282(-14.6,10.05) 283(-14.6,9.75) 284(-14.6,9.45) 285(-14.6,9.15) 286(-14.6,8.85) 287(-14.6,8.55) 288(-14.6,8.25) 289(-14.6,7.95) 290(-14.6,7.65) 291(-14.6,7.35) 292(-14.6,7.05) 293(-14.6,6.75) 294(-14.6,6.45) 295(-14.6,6.15) 296(-14.6,5.85) 297(-14.6,5.55) 298(-14.6,5.25) 299(-14.6,4.95) 300(-14.6,4.65) 301(-14.6,4.35) 302(-14.6,4.05) 303(-14.6,3.75) 304(-14.6,3.45) 305(-14.6,3.15) 306(-14.6,2.85) 307(-14.6,2.55) 308(-14.6,2.25) 309(-14.6,1.95) 310(-14.6,1.65) 311(-14.6,1.35) 312(-14.6,1.05) 313(-14.6,0.75) 314(-14.6,0.45) 315(-14.6,0.15) 316(-14.6,-0.15) 317(-14.6,-0.45) 318(-14.6,-0.75) 319(-14.6,-1.05) 320(-14.6,-1.35) 321(-14.6,-1.65) 322(-14.6,-1.95) 323(-14.6,-2.25) 324(-14.6,-2.55) 325(-14.6,-2.85) 326(-14.6,-3.15) 327(-14.6,-3.45) 328(-14.6,-3.75) 329(-14.6,-4.05) 330(-14.6,-4.35) 331(-14.6,-4.65) 332(-14.6,-4.95) 333(-14.6,-5.25) 334(-14.6,-5.55) 335(-14.6,-5.85) 336(-14.6,-6.15) 337(-14.6,-6.45) 338(-14.6,-6.75) 339(-14.6,-7.05) 340(-14.6,-7.35) 341(-14.6,-7.65) 342(-14.6,-7.95) 343(-14.6,-8.25) 344(-14.6,-8.55) 345(-14.6,-8.85) 346(-14.6,-9.15) 347(-14.6,-9.45) 348(-14.6,-9.75) 349(-14.6,-10.05) 350(-14.6,-10.35) 351(-14.6,-10.65) 352(-14.6,-10.95) 353(-14.6,-11.25) 354(-14.6,-11.55) 355(-14.6,-11.85) 356(-14.6,-12.15) 357(-14.6,-12.45) 358(-14.6,-12.75) 359(-14.6,-13.05) 360(-14.6,-13.35)